# Altium footprint library Library 3D.PcbLib: 288 footprints (part 3 of 18)
Each footprint in its own frame and in the unit in brackets; x right, y up, seen from the top. Pads: shape width x height; smd on the part's side, far side on the other; paste and mask are expansions set on the pad; w line width, h text height; cw(c..) or ccw(c..) is an arc to the next point about the centre after c.
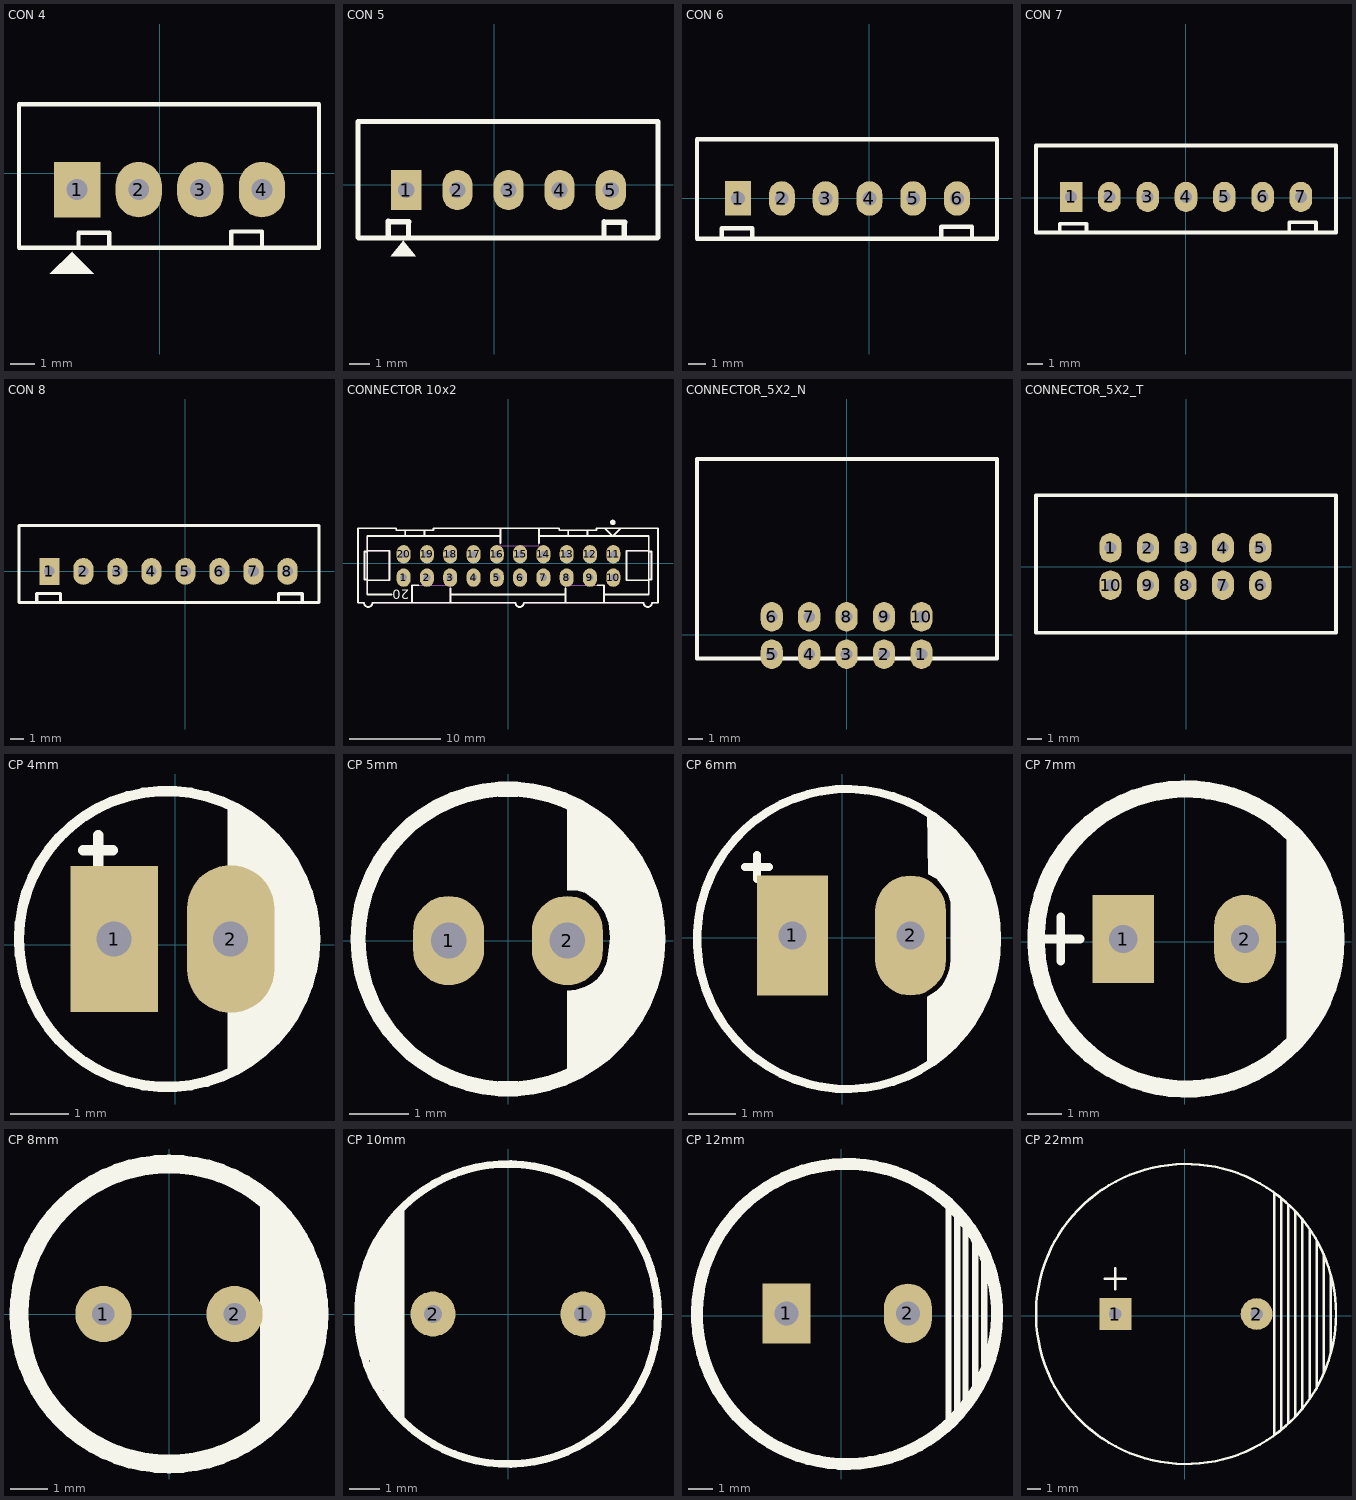
[diagram p2: the footprints below, top view; thin cyan lines are the x and y axes]

## CON 4 [mm]
pads (4):
  rect 1.905x2.286 hole 0.864: 1(-3.4,-0.675)
  oval 1.905x2.286 hole 0.864: 2(-0.86,-0.675) 3(1.68,-0.675) 4(4.22,-0.675)
Top Overlay:
  region: -4.527,-4.15 -2.723,-4.15 -3.612,-3.261 -3.612,-3.236
  lines w0.178: -3.349,-3.075 -3.349,-2.453 -2.079,-2.453 -2.079,-3.05 ; 2.95,-3 2.95,-2.402 4.22,-2.402 4.22,-3.075 ; -5.8,-3.075 6.575,-3.075 6.575,-0.49 6.575,2.85 -5.8,2.85 -5.8,-3.075
3D body "SW3dPS-jst-b4b-xh-a-1.STEP": height 7, standoff -3.4, extent -5.825,-3.025 6.575,2.725

## CON 5 [mm]
pads (5):
  rect 1.5x2 hole 0.8: 1(-4.38,-0.25)
  oval 1.5x2 hole 0.8: 2(-1.84,-0.25) 3(0.7,-0.25) 4(3.24,-0.25) 5(5.78,-0.25)
Top Overlay:
  region: -4.525,-2.775 -5.15,-3.55 -3.9,-3.55
  lines w0.254: -5.275,-2.6 -5.275,-1.8 -5.25,-1.825 -4.25,-1.825 -4.275,-1.85 -4.275,-2.525 ; 5.45,-2.625 5.45,-1.825 5.475,-1.85 6.475,-1.85 6.45,-1.875 6.45,-2.55 ; -6.775,-2.6 -6.775,3.15 8.125,3.15 8.125,-2.6 8.1,-2.625 -6.75,-2.625 -6.775,-2.6
3D body "User Library-JST B5B-XH-A.STEP": height 7, standoff -3.4, extent -6.775,-2.6 8.125,3.15

## CON 6 [mm]
pads (6):
  rect 1.5x2 hole 0.8: 1(-7.62,0)
  oval 1.5x2 hole 0.8: 2(-5.08,0) 3(-2.54,0) 4(0,0) 5(2.54,0) 6(5.08,0)
Top Overlay:
  lines w0.254: -8.575,-2.3 -8.575,-1.725 -6.8,-1.725 -6.8,-2.275 ; 4.175,-2.225 4.175,-1.65 5.95,-1.65 5.95,-2.2 ; -10,-2.325 7.4,-2.325 7.4,3.425 -10,3.425 -10,-2.325
3D body "SW3dPS-jst-b6b-xh-a.STEP": height 7, standoff -3.4, extent -10,-2.325 7.4,3.425

## CON 7 [mm]
pads (7):
  rect 1.5x2 hole 0.8: 1(-7.595,0.05)
  oval 1.5x2 hole 0.8: 2(-5.055,0.05) 3(-2.515,0.05) 4(0.025,0.05) 5(2.565,0.05) 6(5.105,0.05) 7(7.645,0.05)
Top Overlay:
  lines w0.254: -8.35,-2.3 -8.35,-1.725 -6.575,-1.725 -6.575,-2.275 ; 6.875,-2.2 6.875,-1.625 8.65,-1.625 8.65,-2.175 ; -9.925,-2.3 -9.925,3.45 9.975,3.45 9.975,-2.3 -9.925,-2.3
3D body "User Library-B7B-XH-A.STEP": height 7, standoff -3.4, extent -9.925,-2.3 9.975,3.45

## CON 8 [mm]
pads (8):
  rect 1.5x2 hole 0.8: 1(-10.16,0)
  oval 1.5x2 hole 0.8: 2(-7.62,0) 3(-5.08,0) 4(-2.54,0) 5(0,0) 6(2.54,0) 7(5.08,0) 8(7.62,0)
Top Overlay:
  lines w0.254: -11.1,-2.225 -11.1,-1.65 -9.325,-1.65 -9.325,-2.2 ; 6.95,-2.25 6.95,-1.675 8.725,-1.675 8.725,-2.225 ; -12.425,-2.325 -12.425,3.425 9.975,3.425 9.975,-2.325 -12.425,-2.325
3D body "User Library-B8B-XH-A.STEP": height 7, standoff -3.4, extent -12.425,-2.325 9.975,3.425

## CONNECTOR 10x2 [mm]
pads (20):
  oval 1.524x2 hole 0.762: 1(-11.42,-1.57) 2(-8.88,-1.57) 3(-6.34,-1.57) 4(-3.8,-1.57) 5(-1.26,-1.57) 6(1.28,-1.57) 7(3.82,-1.57) 8(6.36,-1.57) 9(8.9,-1.57) 10(11.44,-1.57) 11(11.44,0.97) 12(8.9,0.97) 13(6.36,0.97) 14(3.82,0.97) 15(1.28,0.97) 16(-1.26,0.97) 17(-3.8,0.97) 18(-6.34,0.97) 19(-8.88,0.97) 20(-11.42,0.97)
Top Overlay:
  circle w0.3: c11.39,4.448 r0.15
  lines w0.2: -15.382,-1.854 -12.969,-1.854 -12.969,1.352 -15.382,1.352 ; -15.382,-1.775 -15.686,-1.775 -15.686,1.273 -15.382,1.273 ; -12.74,-3.401 -15.382,-3.401 -15.382,2.949 -0.866,2.949 ; -11.241,2.949 -11.241,3.584 ; -10.518,-4.315 -10.518,-2.41 -9.809,-2.41 ; -9.159,2.949 -9.159,3.584 ; -6.327,-4.315 -6.327,-2.769 ; -6.327,-3.401 6.247,-3.401 ; -0.866,2.187 -0.866,3.813 ; 3.326,2.187 3.326,3.813 ; 3.326,2.949 15.302,2.949 15.302,-3.401 10.438,-3.401 ; 6.247,-4.315 6.247,-2.769 ; 6.539,2.949 6.539,3.584 ; 8.621,2.949 8.621,3.584 ; 9.729,-2.41 10.438,-2.41 10.438,-4.315 ; 10.526,3.813 11.39,2.949 12.254,3.813 ; 15.302,-1.854 12.889,-1.854 12.889,1.352 15.302,1.352 ; 15.302,-1.775 15.606,-1.775 15.606,1.273 15.302,1.273 ; -16.398,-4.315 -16.398,3.813 -12.232,3.813 -12.232,3.584 -8.168,3.584 -8.168,3.813 5.548,3.813 5.548,3.584 9.612,3.584 9.612,3.813 16.318,3.813 16.318,-4.315 15.657,-4.315 cw(c15.2,-4.315) 14.743,-4.315 1.687,-4.315 cw(c1.23,-4.315) 0.773,-4.315 -14.823,-4.315 cw(c-15.28,-4.315) -15.737,-4.315 -16.398,-4.315
  text "20" at -10.835,-2.918 h1.02
Mechanical 14:
  lines w0.1: -15.382,-1.854 -12.969,-1.854 -12.969,1.352 -15.382,1.352 ; -15.382,-1.775 -15.686,-1.775 -15.686,1.273 -15.382,1.273 ; -12.74,-3.401 -15.382,-3.401 -15.382,2.949 -0.866,2.949 ; -11.241,2.949 -11.241,3.584 ; -10.518,-4.315 -10.518,-2.41 -6.327,-2.41 -6.327,-4.315 ; -9.159,2.949 -9.159,3.584 ; -6.327,-3.401 6.247,-3.401 ; -0.866,3.813 -0.866,1.908 3.326,1.908 3.326,3.813 ; 3.326,2.949 15.302,2.949 15.302,-3.401 10.438,-3.401 ; 6.247,-4.315 6.247,-2.41 10.438,-2.41 10.438,-4.315 ; 6.539,2.949 6.539,3.584 ; 8.621,2.949 8.621,3.584 ; 10.526,3.813 11.39,2.949 12.254,3.813 ; 15.302,-1.854 12.889,-1.854 12.889,1.352 15.302,1.352 ; 15.302,-1.775 15.606,-1.775 15.606,1.273 15.302,1.273 ; -16.398,-4.315 -16.398,3.813 -12.232,3.813 -12.232,3.584 -8.168,3.584 -8.168,3.813 5.548,3.813 5.548,3.584 9.612,3.584 9.612,3.813 16.318,3.813 16.318,-4.315 15.657,-4.315 cw(c15.2,-4.315) 14.743,-4.315 1.687,-4.315 cw(c1.23,-4.315) 0.773,-4.315 -14.823,-4.315 cw(c-15.28,-4.315) -15.737,-4.315 -16.398,-4.315
  text "20" at -10.835,-2.918 h1.02
3D body "3M_N2520-6002RB.stp": height 9.65, standoff -2.59, extent -16.35,-4.823 16.365,3.813

## CONNECTOR_5X2_N [mm]
pads (10):
  oval 1.5x2 hole 0.8: 1(5.08,-1.33) 2(2.54,-1.33) 3(0,-1.33) 4(-2.54,-1.33) 5(-5.08,-1.33) 6(-5.08,1.21) 7(-2.54,1.21) 8(0,1.21) 9(2.54,1.21) 10(5.08,1.21)
Top Overlay:
  lines w0.254: -10.155,-1.625 10.205,-1.625 10.205,11.917 -10.155,11.917 -10.155,-1.625
3D body "User Library-BHR-10___64.STEP": height 8.9, standoff -3.3, extent -10.155,-1.625 10.205,11.917

## CONNECTOR_5X2_T [mm]
pads (10):
  oval 1.5x2 hole 0.8: 1(-5.12,1.29) 2(-2.58,1.29) 3(-0.04,1.29) 4(2.5,1.29) 5(5.04,1.29) 6(5.04,-1.25) 7(2.5,-1.25) 8(-0.04,-1.25) 9(-2.58,-1.25) 10(-5.12,-1.25)
Top Overlay:
  lines w0.254: -10.18,-4.475 10.18,-4.475 10.18,4.85 -10.18,4.85 -10.18,-4.475
3D body "User Library-BH-10___64.STEP": height 8.84, standoff -3.3, extent -10.23,-4.45 10.13,4.75

## CP 4mm [mm]
pads (2):
  rect 1.5x2.5 hole 0.6: 1(-1.05,0.1)
  oval 1.5x2.54 hole 0.6: 2(0.95,0.1)
Top Overlay:
  circle w0.178: c-0.142,0.1 r2.54
  region: 0.9,2.4 0.9,-2.225 1.35,-1.975 1.725,-1.625 2.05,-1.225 2.25,-0.8 2.35,-0.6 2.465,0.134 2.425,0.375 2.35,0.675 2.175,1.2 1.975,1.525 1.725,1.825 1.45,2.1 1.125,2.325
  lines w0.178: -1.579,1.624 -1.071,1.624 ; -1.325,1.37 -1.325,1.878
3D body "User Library-Cap electro 5x7x2mm.STEP": height 7.29, standoff -3.51, extent -2.58,-2.425 2.47,2.625

## CP 5mm [mm]
pads (2):
  oval 1.2x1.5 hole 0.6: 1(-1,0) 2(1,0)
Top Overlay:
  circle w0.254: c0,0.025 r2.525
  region: 1,2.35 1,0.85 1.15,0.85 1.3,0.8 1.5,0.65 1.625,0.475 1.7,0.3 1.725,0.05 1.7,-0.175 1.675,-0.35 1.65,-0.4 1.625,-0.45 1.6,-0.525 1.5,-0.65 1.4,-0.725 1.3,-0.775 1.15,-0.825 1,-0.85 1,-2.3 1.475,-2.025 1.875,-1.675 2.175,-1.275 2.4,-0.825 2.5,-0.4 2.525,0.025 2.525,0.475 2.4,0.9 2.175,1.35 1.85,1.775 1.675,1.95 1.45,2.1 1.25,2.25
3D body "SW3dPS-Cap electro 5x11x2mm.STEP": height 11.23, standoff -3.57, extent -2.525,-2.525 2.525,2.525

## CP 6mm [mm]
pads (2):
  rect 1.5x2.54 hole 0.6: 1(-1.05,0.05)
  oval 1.5x2.54 hole 0.6: 2(1.45,0.05)
Top Overlay:
  circle w0.178: c0.105,-0.025 r3.175
  region: 1.807,2.667 1.825,1.35 2,1.25 2.125,1.1 2.25,0.925 2.3,0.75 2.3,-0.475 2.275,-0.65 2.25,-0.75 2.2,-0.875 2.125,-1 2,-1.125 1.8,-1.25 1.807,-2.743 2.162,-2.463 2.696,-1.854 3.128,-1.041 3.255,-0.381 3.28,-0.025 3.229,0.585 3.001,1.245 2.645,1.855 2.264,2.337
  lines w0.178: -2.054,1.499 -1.546,1.499 ; -1.8,1.245 -1.8,1.753
3D body "User Library-Cap 6_3x11.STEP": height 11.02, standoff -18.98, extent -2.968,-3.099 3.332,3.201

## CP 7mm [mm]
pads (2):
  rect 1.778x2.54 hole 0.813: 1(-1.775,0.075)
  oval 1.778x2.54 hole 0.813: 2(1.725,0.075)
Top Overlay:
  circle w0.5: c0.03,0.075 r4.318
  lines w0.254: -4.161,0.075 -3.018,0.075 ; -3.577,-0.56 -3.577,0.71 ; 3.05,-2.95 3.05,3.075 ; 3.3,-2.675 3.3,2.825 ; 3.55,-2.35 3.55,2.55 ; 3.75,-1.85 3.75,1.875 ; 3.95,-1.325 3.95,1.475 ; 4.125,-0.5 4.125,0.475
3D body "User Library-CAP 8X11_5.STEP": height 11.33, standoff -19.16, extent -4.033,-3.925 3.967,4.075

## CP 8mm [mm]
pads (2):
  round 1.5 hole 0.6: 1(-1.75,0) 2(1.75,0)
Top Overlay:
  circle w0.5: c0,0 r4
  lines w0.254: 2.55,3.1 2.55,-2.875 2.675,-2.75 2.675,2.625 2.75,2.7 ; 2.85,-2.55 2.85,2.6 3.025,2.425 3.025,-2.275 3.25,-2.05 3.25,1.975 3.475,1.75 3.475,-1.45 3.475,-1.775 3.65,-1.6 3.65,0.975
3D body "SW3dPS-Cap electro 8x11.5x3.5mm.STEP": height 12.03, standoff -3.48, extent -4.051,-4 4,4.051

## CP 10mm [mm]
pads (2):
  round 1.5 hole 0.6: 1(2.5,0) 2(-2.5,0)
Top Overlay:
  circle w0.254: c0,0 r5
  lines w0.254: -4.902,-0.94 -4.902,0.66 ; -4.699,-1.448 -4.699,1.549 ; -4.47,-2.108 -4.47,2.235 ; -4.267,-2.515 -4.267,2.54 ; -4.013,-2.946 -4.013,2.896 ; -3.81,-3.2 -3.81,3.175 ; -3.581,-3.404 -3.581,3.48
3D body "SW3dPS-Cap electro 10x12.5x5.0mm.STEP": height 12.83, standoff -3.68, extent -5.025,-5.025 5.025,5.025

## CP 12mm [mm]
pads (2):
  rect 2x2.5 hole 1: 1(-2.29,0.1)
  oval 2x2.5 hole 1: 2(2.79,0.1)
Top Overlay:
  lines w0.254: 4.475,-4.275 4.475,4.65 ; 4.847,-3.897 4.847,4.328 ; 5.2,-3.55 5.2,3.875 ; 5.6,-3.25 5.6,3.55 ; 5.975,-2 5.975,2.375
  lines w0.5: 4.806,4.373 ccw(c0.242,0.078) 4.847,4.328
3D body "User Library-Capacitor Radial Electrolitic 500-1250x2500.step": height 2.2, standoff -25.51, extent -6,-6.15 6.457,6.35

## CP 22mm [mil]
pads (2):
  rect 90x90 hole 35: 1(-195.87,4.92)
  round 90 hole 35: 2(204.13,4.92)
Top Overlay:
  circle w7: c4.13,4.92 r425
  lines w7: -225.87,104.92 -165.87,104.92 ; -195.87,74.92 -195.87,134.92 ; 254.13,-335.08 254.13,344.92 ; 274.13,-320.08 274.13,329.92 ; 294.13,-305.08 294.13,314.92 ; 314.13,-285.08 314.13,294.92 ; 334.13,-260.08 334.13,269.92 ; 354.13,-235.08 354.13,244.92 ; 374.13,-205.08 374.13,209.92 ; 394.13,-160.08 394.13,174.92
  lines w8: 414.13,-105.08 414.13,114.92
3D body: height 196.85, standoff 0, extent 169.41,-30.01 239.14,39.85
3D body "User Library-ECEC2DP271BJ.STEP": height 984.25, standoff 0, extent -432.01,-433.15 434.13,432.99